# Altium footprint library TIDA_00620.PcbLib: 53 footprints (part 1 of 4)
Each footprint in its own frame and in the unit in brackets; x right, y up, seen from the top. Pads: shape width x height; smd on the part's side, far side on the other; paste and mask are expansions set on the pad; w line width, h text height; cw(c..) or ccw(c..) is an arc to the next point about the centre after c.
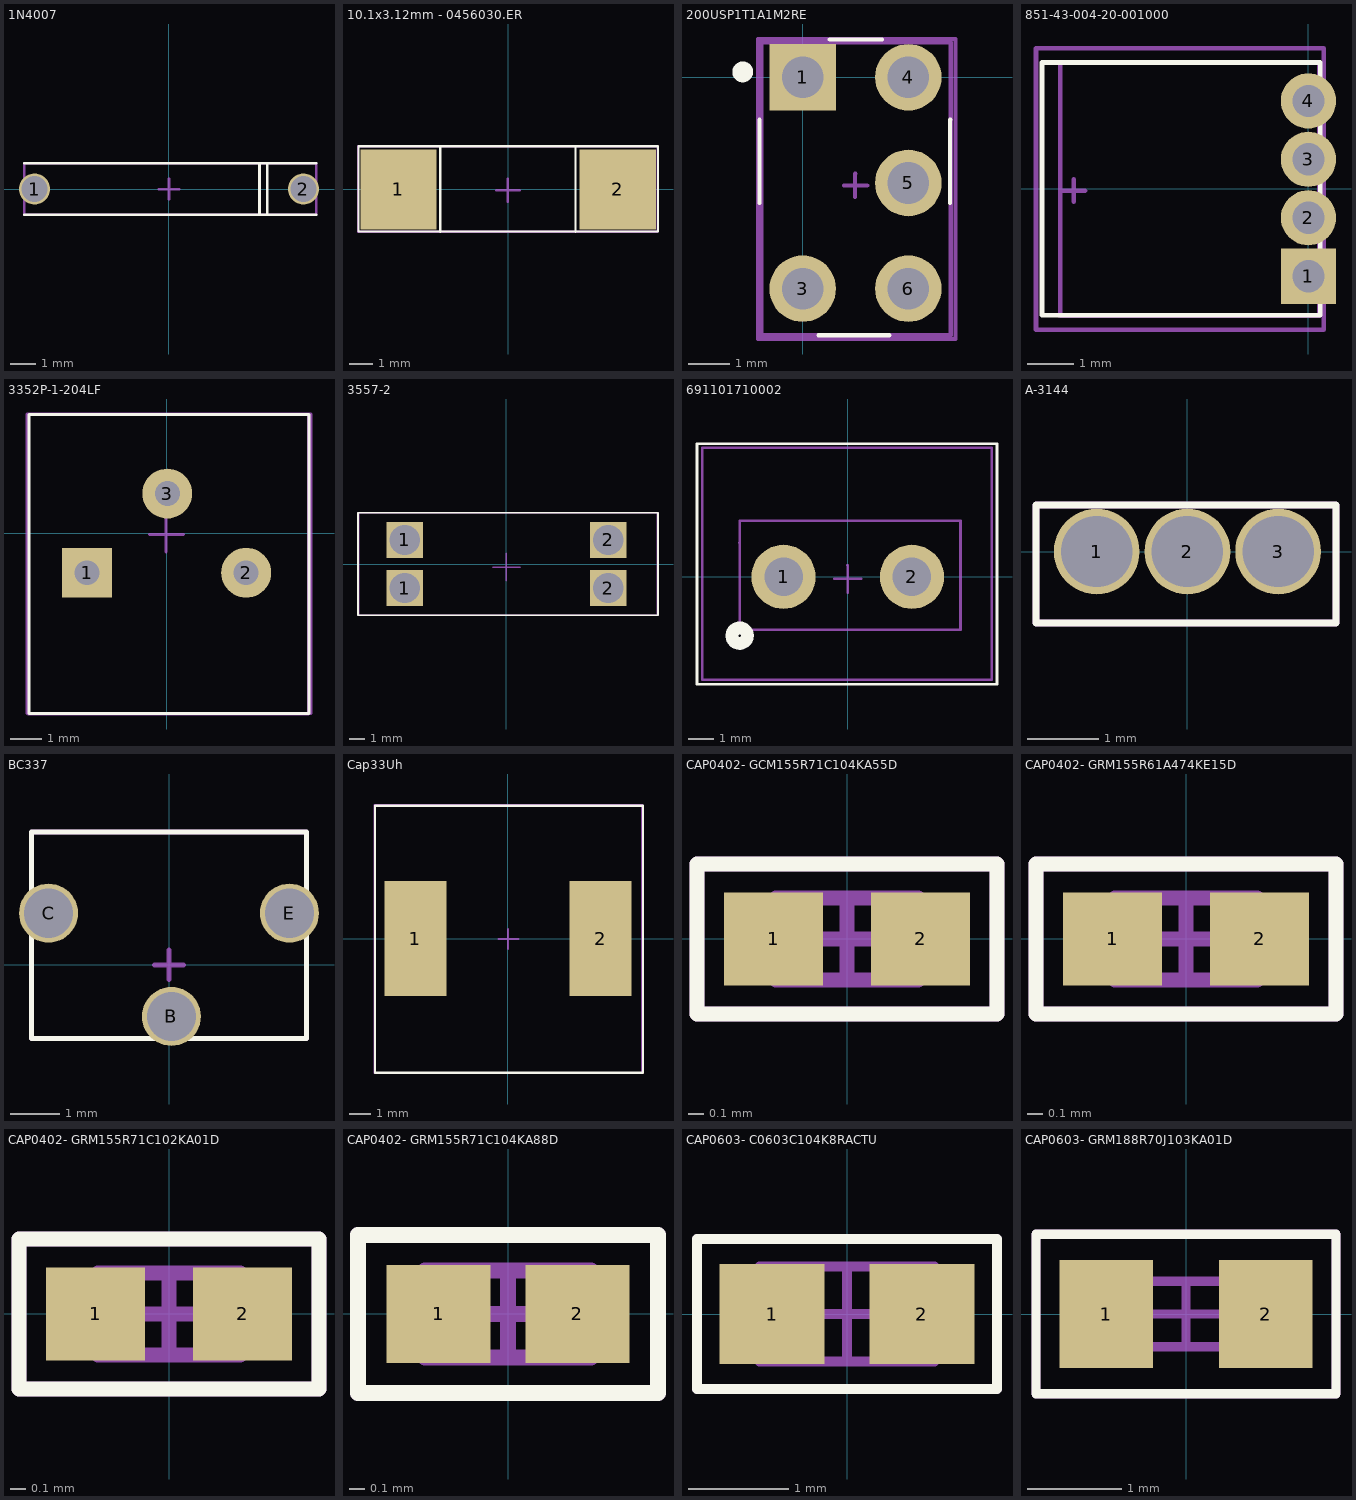
[diagram p0: the footprints below, top view; thin cyan lines are the x and y axes]

## 1N4007 [mm]
pads (2):
  round 1.2 hole 1 mask+0.05: 1(-5.2,0) 2(5.2,0)
Top Overlay:
  lines w0.1: -5.6,-1 5.7,-1 ; -5.6,1 5.7,1 ; 3.4,-1 3.5,-1 3.5,1 ; 3.7,1 3.8,1 3.8,-1
Top 3D Body:
  lines w0.1: -5.6,-1 -5.6,1 5.7,1 5.7,-1 -5.6,-1
Top Component Center:
  lines w0.1: -0.399,-0.011 0.401,-0.011 ; 0,-0.4 0,0.4 ; -5.6,-1 -5.6,1 5.7,1 5.7,-1 -5.6,-1
Top Designator:
  text ".Designator" at 2.081,-0.157 h0.5
3D body "Diode.STEP": height 1.99, standoff -2, extent -5.555,-1 5.615,1

## 10.1x3.12mm - 0456030.ER [mm]
pads (2):
  rect 3.25x3.43 smd mask+0.05: 1(-4.675,0) 2(4.675,0)
Top Overlay:
  lines w0.1: -6.37,1.85 -6.38,1.85 ; -2.894,-1.808 -2.894,1.832 ; 2.87,-1.8 2.87,1.84 2.91,1.84 2.88,1.84 ; -6.38,1.85 -6.38,-1.79 6.39,-1.79 6.39,1.85 -6.38,1.85
Bottom Overlay:
  text "Fuse" at 1.996,-0.506 h1.52
Top 3D Body:
  text "Ls" at -0.78,0.172 h1.2
Top Component Center:
  lines w0.1: -6.39,1.84 -6.4,1.84 ; -0.51,-0.03 0.49,-0.03 ; -0.01,-0.53 -0.01,0.47 ; -6.4,1.84 -6.4,-1.8 6.37,-1.8 6.37,1.84 -6.4,1.84
Top Designator:
  text ".Designator" at 1.681,-0.257 h0.5
3D body "0456030.ER.STEP": height 3.11, standoff -0.01, extent -5.36,-1.38 4.74,1.74

## 200USP1T1A1M2RE [mm] "Switch, 7x4.5mm"
pads (5):
  rect 1.6x1.6 hole 1 mask+0.05: 1(0,0)
  round 1.6 hole 1 mask+0.05: 3(0,-5.08) 4(2.54,0) 5(2.54,-2.54) 6(2.54,-5.08)
Top Overlay:
  circle w0.3: c-1.44,0.13 r0.1
  lines w0.1: -1.04,-3.02 -1.04,-1.02 ; 0.38,-6.2 2.08,-6.2 ; 0.65,0.91 1.91,0.91 ; 3.54,-3.02 3.543,-3.02 3.543,-1.02 3.55,-1.02
Top 3D Body:
  lines w0.1: -0.99,-6.2 -0.99,0.84 3.56,0.84 3.56,-6.2 -0.99,-6.2
Top Component Center:
  lines w0.1: 0.992,-2.599 1.552,-2.599 ; 1.26,-2.88 1.26,-2.32 1.27,-2.32 ; -1.07,-6.29 -1.07,0.92 -1.01,0.92 3.67,0.92 3.67,-6.29 -1.07,-6.29
Top Designator:
  text ".Designator" at 0.881,-2.957 h0.5
3D body "200USP1T1A1M2RE--3DModel-STEP-520916.STEP": height 11.12, standoff -3.27, extent -0.97,-6.17 3.53,0.83

## 851-43-004-20-001000 [mm]
pads (4):
  rect 1.2x1.2 hole 0.7 mask+0.05: 1(0,-1.905)
  round 1.2 hole 0.7 mask+0.05: 2(0,-0.635) 3(0,0.635) 4(0,1.905)
Top Overlay:
  lines w0.1: -5.79,-2.75 0.26,-2.75 0.26,2.74 -5.38,2.74 -5.79,2.74 -5.79,-2.75
Top 3D Body:
  lines w0.1: -5.39,-2.765 -5.39,2.745 -5.33,2.745 0.24,2.745 0.24,-2.765 -5.39,-2.765
Top Component Center:
  lines w0.1: -5.345,-0.045 -4.855,-0.045 ; -5.1,-0.29 -5.1,0.2 ; -5.92,-3.065 -5.92,2.775 -5.92,3.045 0.33,3.045 0.33,-3.065 -5.92,-3.065
Top Designator:
  text ".Designator" at -2.597,-0.262 h0.5
3D body "mill-max-851-93-004-20-001000.STEP": height 2.21, standoff -2.81, extent -5.39,-2.716 0.147,2.745

## 3352P-1-204LF [mm]
pads (3):
  rect 1.6x1.6 hole 0.8 mask+0.05: 1(-2.55,-1.27)
  round 1.6 hole 0.8 mask+0.05: 2(2.55,-1.27) 3(0.02,1.27)
Top Overlay:
  lines w0.1: -4.42,-5.78 4.57,-5.78 4.57,3.8 -4.42,3.8 -4.42,-5.78
Top 3D Body:
  lines w0.1: -4.48,-5.78 -4.48,3.82 -4.37,3.82 4.63,3.82 4.63,-5.78 -4.48,-5.78
Top Component Center:
  lines w0.1: -4.38,3.8 -4.44,3.8 ; -0.541,-0.047 0.539,-0.047 ; -0.02,-0.61 -0.02,0.47 ; -4.44,3.8 4.55,3.8 4.55,-5.8 -4.44,-5.8 -4.44,3.8
Top Designator:
  text ".Designator" at 1.281,-1.807 h0.5
3D body "3352P-1-204LF.STEP": height 5.33, standoff -4.75, extent -4.384,-5.718 4.504,3.802

## 3557-2 [mm]
pads (4):
  rect 2.4x2.4 hole 2 mask+0.05: 1(-6.75,-1.6) 1(-6.75,1.6) 2(6.75,-1.6) 2(6.75,1.6)
Top Overlay:
  lines w0.1: -9.85,-3.4 10.05,-3.4 10.05,3.4 -9.75,3.4 -9.85,3.4 -9.85,-3.4
Top 3D Body:
  lines w0.1: -9.85,-3.4 10.05,-3.4 10.05,3.4 -9.85,3.4 -9.85,-3.4
Top Component Center:
  lines w0.1: -0.9,-0.2 0.9,-0.2 ; 0,-1.1 0,0.7 ; -9.8,-3.4 10,-3.4 10,3.4 -9.8,3.4 -9.8,-3.4
Top Designator:
  text ".Designator" at 7.481,-0.307 h0.5
3D body "3557-2--3DModel-STEP-510211.STEP": height 7.37, standoff -2.79, extent -9.855,-3.365 9.955,3.365

## 691101710002 [mm]
pads (2):
  round 2.5 hole 1.5 mask+0.05: 1(-2.5,0) 2(2.5,0)
Top Overlay:
  circle w0.5: c-4.21,-2.29 r0.3
  lines w0.1: -5.84,5.19 -5.87,5.19 ; -5.87,5.19 -5.87,-4.19 5.81,-4.19 5.81,5.19 -5.87,5.19
Top 3D Body:
  lines w0.1: -5.67,-4 -5.67,5.03 -5.65,5.03 5.6,5.03 5.6,-4 -5.67,-4
Top Component Center:
  lines w0.1: -4.22,1.32 -4.21,1.32 ; -0.53,-0.08 0.53,-0.08 ; -0.01,0.45 0,0.45 0,-0.61 ; -4.21,1.32 -4.21,-2.06 4.39,-2.06 4.39,2.18 -4.21,2.18 -4.21,1.32
Top Designator:
  text ".Designator" at -2.399,-0.177 h0.5
3D body "691101710002+%28rev1%29.stp": height 12.5, standoff -3.9, extent -5.64,-3.99 5.56,5.01

## A-3144 [mm] "HALL SENSOR"
pads (3):
  round 1.2 hole 1 mask+0.05: 1(-1.27,0) 2(0,0) 3(1.27,0)
Top Overlay:
  lines w0.1: -2.12,-1 2.08,-1 2.08,0.65 -2.12,0.65 -2.12,-1
Top 3D Body:
  lines w0.1: -2.12,-1 2.08,-1 2.08,0.65 -2.12,0.65 -2.12,-1
Top Component Center:
  lines w0.1: -0.277,-0.012 0.273,-0.012 ; 0,-0.3 0,0.25 ; -2.12,-1 2.08,-1 2.08,0.65 -2.12,0.65 -2.12,-1
Top Designator:
  text ".Designator" at -0.249,-0.367 h0.5
3D body "User Library-to-92ua-1.step": height 3.1, standoff -3.16, extent -2.139,-0.959 2.031,0.621

## BC337 [mm]
pads (3):
  round 1.2 hole 1 mask+0.05: B(0.05,-1.05) C(-2.45,1.05) E(2.45,1.05)
Top Overlay:
  lines w0.1: -2.8,-1.5 -2.8,2.7 2.8,2.7 2.8,-1.5 -2.8,-1.5
Top 3D Body:
  lines w0.1: -2.8,-1.5 -2.8,2.7 2.8,2.7 2.8,-1.5 -2.8,-1.5
Top Component Center:
  lines w0.1: -0.3,0 0.3,0 ; 0,-0.3 0,0.3 ; -2.8,-1.5 -2.8,2.7 2.8,2.7 2.8,-1.5 -2.8,-1.5
Top Designator:
  text ".Designator" at 0.251,0.183 h0.5
3D body "TO-92_Wide2.step": height 7.9, standoff -2.4, extent -2.76,-1.42 2.78,2.677

## Cap33Uh [mm]
pads (2):
  rect 2.9x5.4 smd mask+0.05: 1(-4.35,0) 2(4.35,0)
Top Overlay:
  lines w0.1: -6.25,-6.3 -6.25,6.25 6.34,6.25 6.34,-6.3 -6.25,-6.3
Top 3D Body:
  lines w0.1: -6.28,6.27 -6.28,-6.31 6.31,-6.31 6.31,6.27 -6.24,6.27
Top Component Center:
  lines w0.1: -0.449,-0.017 0.481,-0.017 ; 0,-0.48 0,0.45 ; -6.26,-6.32 -6.26,6.29 6.32,6.29 6.32,-6.32 -6.26,-6.32
Top Designator:
  text ".Designator" at 2.261,-0.487 h0.5
3D body "srr1260-330m.stp": height 6, standoff 0, extent -6.24,-6.24 6.26,6.26

## CAP0402- GCM155R71C104KA55D [mm] "Chip Capacitor, 2-Leads, Body 1,00x0,50mm, IPC Medium Density"
height 0.55
pads (2):
  rect 0.66x0.62 smd mask+0.05: 1(-0.49,0) 2(0.49,0)
Top Overlay:
  lines w0.1: -1,-0.5 1,-0.5 1,0.5 -1,0.5 -1,-0.5
Top 3D Body:
  lines w0.1: -0.475,-0.275 0.475,-0.275 0.475,0.275 -0.475,0.275 -0.475,-0.275
Top Component Center:
  lines w0.1: -0.275,0 0.275,0 ; 0,-0.275 0,0.275 ; -1,-0.5 1,-0.5 1,0.5 -1,0.5 -1,-0.5
Top Designator:
  text ".Designator" at -0.749,-0.217 h0.5
3D body: height 0.55, standoff 0, extent 0.225,-0.275 0.475,0.275
3D body: height 0.55, standoff 0, extent -0.475,-0.275 -0.225,0.275
3D body: height 0.55, standoff 0, extent -0.225,-0.275 0.225,0.275

## CAP0402- GRM155R61A474KE15D [mm] "Chip Capacitor, 2-Leads, Body 1,00x0,50mm, IPC Medium Density"
height 0.55
pads (2):
  rect 0.66x0.62 smd mask+0.05: 1(-0.49,0) 2(0.49,0)
Top Overlay:
  lines w0.1: -1,-0.5 1,-0.5 1,0.5 -1,0.5 -1,-0.5
Top 3D Body:
  lines w0.1: -0.475,-0.275 0.475,-0.275 0.475,0.275 -0.475,0.275 -0.475,-0.275
Top Component Center:
  lines w0.1: -0.275,0 0.275,0 ; 0,-0.275 0,0.275 ; -1,-0.5 1,-0.5 1,0.5 -1,0.5 -1,-0.5
Top Designator:
  text ".Designator" at -0.767,-0.267 h0.5
3D body: height 0.55, standoff 0, extent 0.225,-0.275 0.475,0.275
3D body: height 0.55, standoff 0, extent -0.475,-0.275 -0.225,0.275
3D body: height 0.55, standoff 0, extent -0.225,-0.275 0.225,0.275

## CAP0402- GRM155R71C102KA01D [mm] "Chip Capacitor, 2-Leads, Body 1,00x0,50mm, IPC Medium Density"
height 0.55
pads (2):
  rect 0.66x0.62 smd mask+0.05: 1(-0.49,0) 2(0.49,0)
Top Overlay:
  lines w0.1: -1,-0.5 -1,0.5 1,0.5 1,-0.5 -1,-0.5
Top 3D Body:
  lines w0.1: -0.475,-0.275 -0.475,0.275 0.475,0.275 0.475,-0.275 -0.475,-0.275
Top Component Center:
  lines w0.1: -0.275,0 0.275,0 ; 0,-0.275 0,0.275 ; -1,-0.5 -1,0.5 1,0.5 1,-0.5 -1,-0.5
Top Designator:
  text ".Designator" at -0.649,-0.217 h0.5
3D body: height 0.55, standoff 0, extent -0.225,-0.275 0.225,0.275
3D body: height 0.55, standoff 0, extent -0.475,-0.275 -0.225,0.275
3D body: height 0.55, standoff 0, extent 0.225,-0.275 0.475,0.275

## CAP0402- GRM155R71C104KA88D [mm] "Chip Capacitor, 2-Leads, Body 1,00x0,50mm, IPC Medium Density"
height 0.55
pads (2):
  rect 0.66x0.62 smd mask+0.05: 1(-0.44,0) 2(0.44,0)
Top Overlay:
  lines w0.1: -0.95,-0.5 0.95,-0.5 0.95,0.5 -0.95,0.5 -0.95,-0.5
Top 3D Body:
  lines w0.1: -0.525,-0.275 0.525,-0.275 0.525,0.275 -0.525,0.275 -0.525,-0.275
Top Component Center:
  lines w0.1: -0.275,0 0.275,0 ; 0,-0.275 0,0.275 ; -0.95,-0.5 0.95,-0.5 0.95,0.5 -0.95,0.5 -0.95,-0.5
Top Designator:
  text ".Designator" at -0.267,-0.217 h0.5
3D body: height 0.55, standoff 0, extent 0.275,-0.275 0.525,0.275
3D body: height 0.55, standoff 0, extent -0.525,-0.275 -0.275,0.275
3D body: height 0.55, standoff 0, extent -0.275,-0.275 0.275,0.275

## CAP0603- C0603C104K8RACTU [mm] "Chip Capacitor, 2-Leads, Body 1,60x0,80mm, IPC Medium Density"
height 0.87
pads (2):
  rect 1.05x1 smd mask+0.05: 1(-0.75,0) 2(0.75,0)
Top Overlay:
  lines w0.1: -1.5,-0.75 -1.5,0.75 1.5,0.75 1.5,-0.75 -1.5,-0.75
Top 3D Body:
  lines w0.1: -0.875,-0.475 0.875,-0.475 0.875,0.475 -0.875,0.475 -0.875,-0.475
Top Component Center:
  lines w0.1: -0.475,0 0.475,0 ; 0,-0.475 0,0.475 ; -1.5,-0.75 -1.5,0.75 1.5,0.75 1.5,-0.75 -1.5,-0.75
Top Designator:
  text ".Designator" at -0.467,-0.167 h0.5
3D body: height 0.87, standoff 0, extent 0.525,-0.475 0.875,0.475
3D body: height 0.87, standoff 0, extent -0.875,-0.475 -0.525,0.475
3D body: height 0.87, standoff 0, extent -0.525,-0.475 0.525,0.475

## CAP0603- GRM188R70J103KA01D [mm] "Chip Capacitor, 2-Leads, Body 1,60x0,80mm, IPC Medium Density"
height 0.9
pads (2):
  rect 1x1.15 smd mask+0.05: 1(-0.85,0) 2(0.85,0)
Top Overlay:
  lines w0.1: -1.6,-0.85 -1.6,0.85 1.6,0.85 1.6,-0.85 -1.6,-0.85
Top 3D Body:
  lines w0.1: -0.75,-0.35 -0.75,0.35 0.75,0.35 0.75,-0.35 -0.75,-0.35
Top Component Center:
  lines w0.1: -0.35,0 0.35,0 ; 0,-0.35 0,0.35 ; -1.6,-0.85 -1.6,0.85 1.6,0.85 1.6,-0.85 -1.6,-0.85
3D body: height 0.9, standoff 0, extent -0.4,-0.35 0.4,0.35
3D body: height 0.9, standoff 0, extent -0.75,-0.35 -0.4,0.35
3D body: height 0.9, standoff 0, extent 0.4,-0.35 0.75,0.35